# Altium schematic symbol library Regulator_Linear.SchLib: 1538 symbols (part 7 of 9)
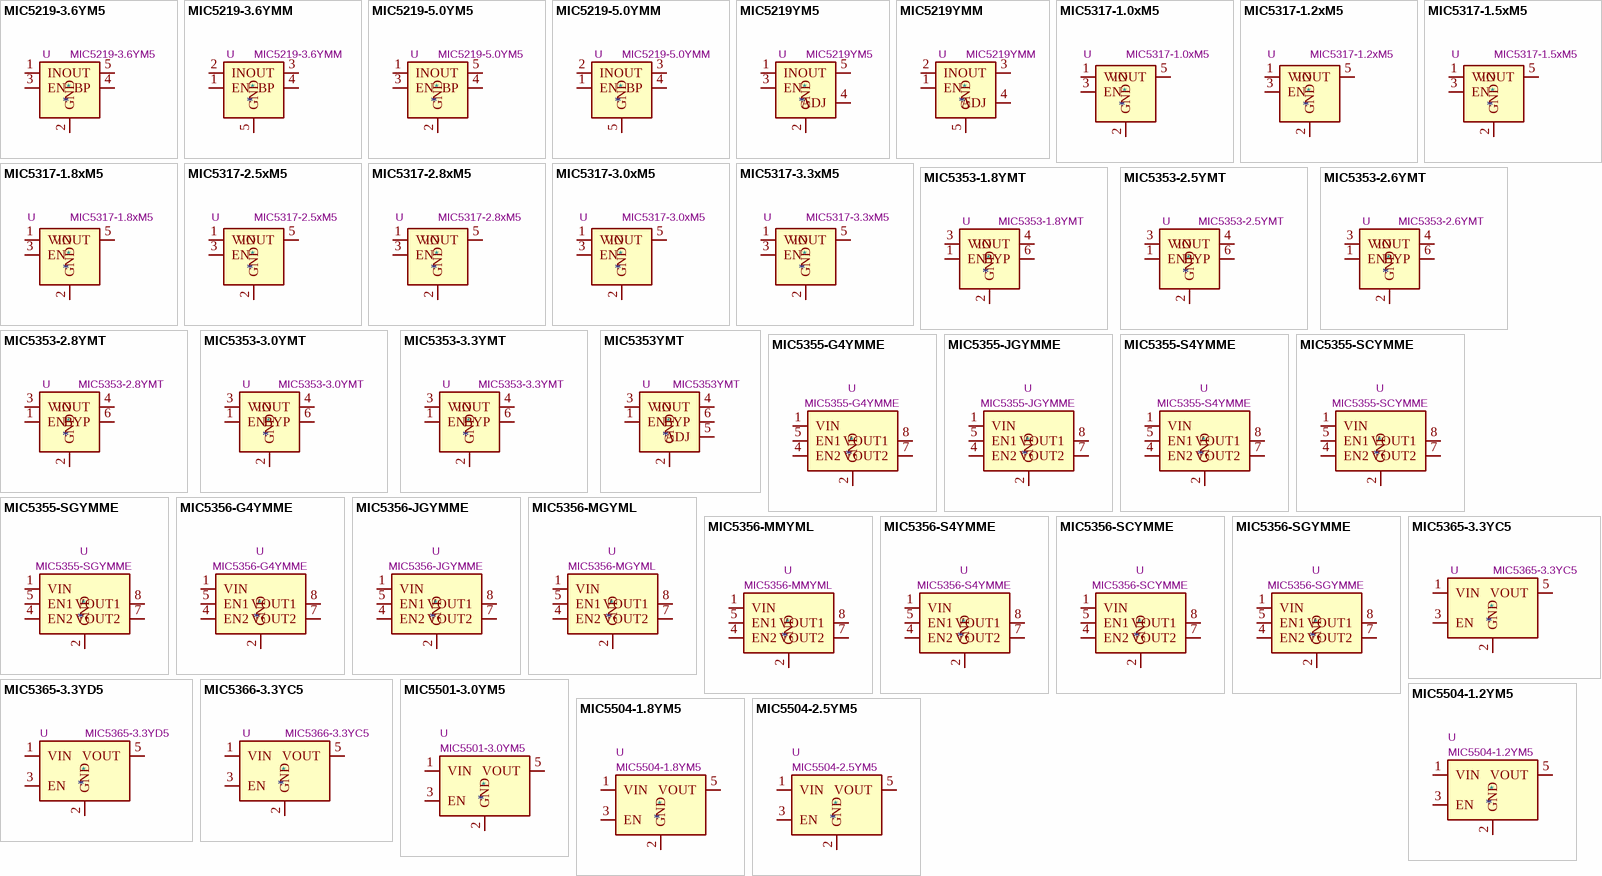
[diagram p44: symbols MIC5219-3.6YM5 to MIC5504-2.5YM5]

## MIC5366-3.3YC5
designator *  value MIC5366-3.3YC5  Reference: U
ki_keywords: Micrel LDO voltage regulator; ki_description: 150mA Low-dropout Voltage Regulator, Vout 3.3V, Output discharge circuit, Vin up to 5.5V, SC-70-5; ki_fp_filters: SOT*353*SC*70*; Footprint: Package_TO_SOT_SMD:SOT-353_SC-70-5; Datasheet: http://ww1.microchip.com/downloads/en/DeviceDoc/mic5365.pdf
pins: 1 VIN, 2 GND, 3 EN, 4 NC hidden, 5 VOUT

## MIC5501-3.0YM5
designator *  value MIC5501-3.0YM5  Reference: U
ki_keywords: Micrel LDO voltage regulator; ki_description: 300mA Low-dropout Voltage Regulator, Vout 3.0V, Vin up to 5.5V, SOT-23; ki_fp_filters: SOT?23?5*; Footprint: Package_TO_SOT_SMD:SOT-23-5; Datasheet: http://ww1.microchip.com/downloads/en/DeviceDoc/MIC550X.pdf
pins: 1 VIN, 2 GND, 3 EN, 4 NC hidden, 5 VOUT

## MIC5504-1.2YM5
designator *  value MIC5504-1.2YM5  Reference: U
ki_keywords: Micrel LDO voltage regulator; ki_description: 300mA Low-dropout Voltage Regulator, Vout 1.2V, Vin up to 5.5V, SOT-23; ki_fp_filters: SOT?23?5*; Footprint: Package_TO_SOT_SMD:SOT-23-5; Datasheet: http://ww1.microchip.com/downloads/en/DeviceDoc/MIC550X.pdf
pins: 1 VIN, 2 GND, 3 EN, 4 NC hidden, 5 VOUT

## MIC5504-1.8YM5
designator *  value MIC5504-1.8YM5  Reference: U
ki_keywords: Micrel LDO voltage regulator; ki_description: 300mA Low-dropout Voltage Regulator, Vout 1.8V, Vin up to 5.5V, SOT-23; ki_fp_filters: SOT?23?5*; Footprint: Package_TO_SOT_SMD:SOT-23-5; Datasheet: http://ww1.microchip.com/downloads/en/DeviceDoc/MIC550X.pdf
pins: 1 VIN, 2 GND, 3 EN, 4 NC hidden, 5 VOUT

## MIC5504-2.5YM5
designator *  value MIC5504-2.5YM5  Reference: U
ki_keywords: Micrel LDO voltage regulator; ki_description: 300mA Low-dropout Voltage Regulator, Vout 2.5V, Vin up to 5.5V, SOT-23; ki_fp_filters: SOT?23?5*; Footprint: Package_TO_SOT_SMD:SOT-23-5; Datasheet: http://ww1.microchip.com/downloads/en/DeviceDoc/MIC550X.pdf
pins: 1 VIN, 2 GND, 3 EN, 4 NC hidden, 5 VOUT

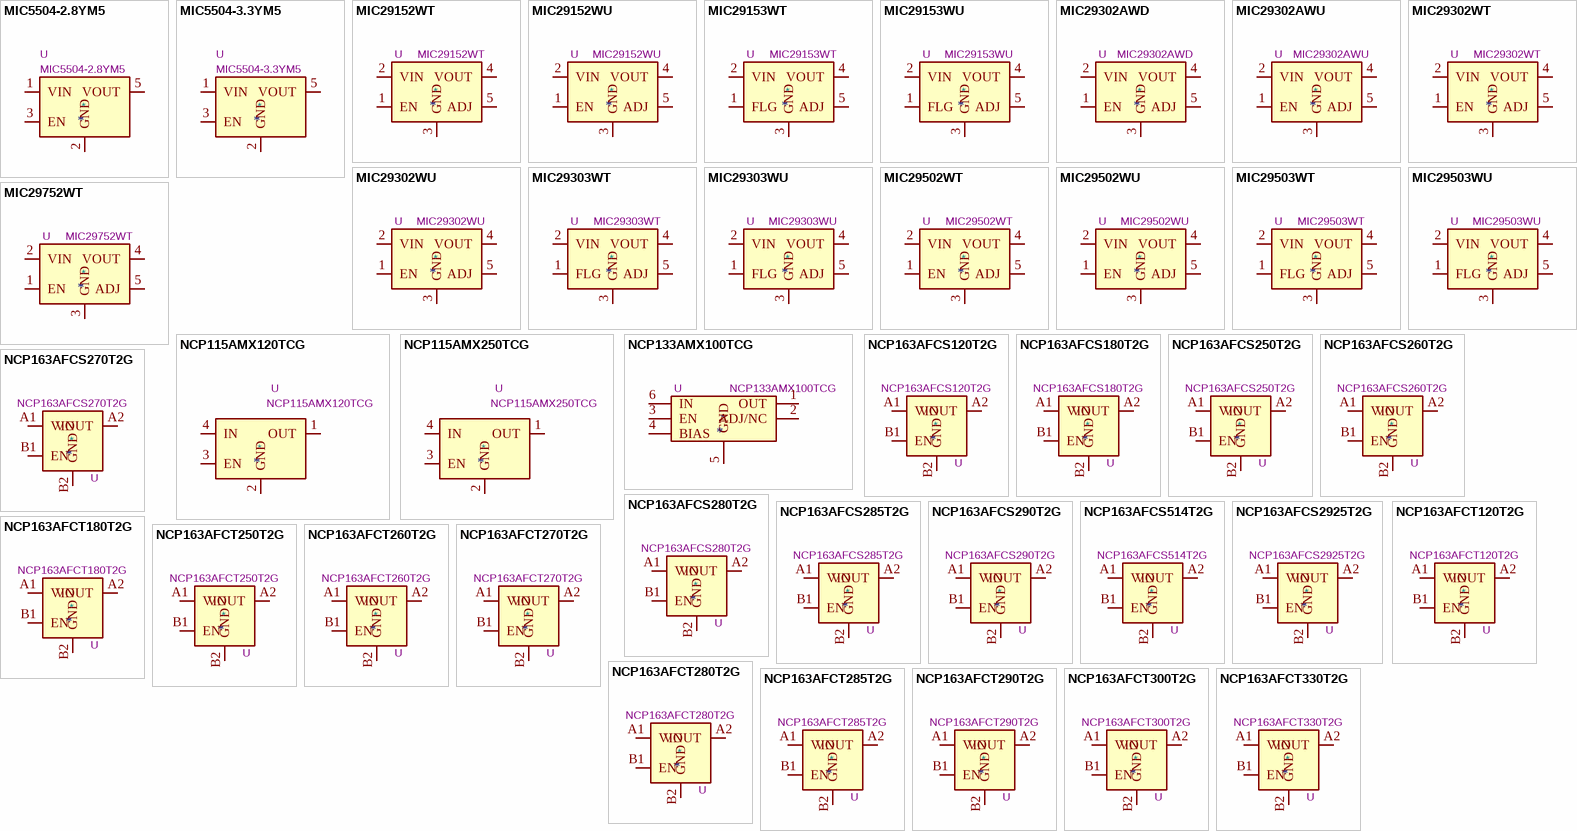
[diagram p27: symbols MIC5504-2.8YM5 to NCP163AFCT330T2G]

## MIC5504-2.8YM5
designator *  value MIC5504-2.8YM5  Reference: U
ki_keywords: Micrel LDO voltage regulator; ki_description: 300mA Low-dropout Voltage Regulator, Vout 2.8V, Vin up to 5.5V, SOT-23; ki_fp_filters: SOT?23?5*; Footprint: Package_TO_SOT_SMD:SOT-23-5; Datasheet: http://ww1.microchip.com/downloads/en/DeviceDoc/MIC550X.pdf
pins: 1 VIN, 2 GND, 3 EN, 4 NC hidden, 5 VOUT

## MIC5504-3.3YM5
designator *  value MIC5504-3.3YM5  Reference: U
ki_keywords: Micrel LDO voltage regulator; ki_description: 300mA Low-dropout Voltage Regulator, Vout 3.3V, Vin up to 5.5V, SOT-23; ki_fp_filters: SOT?23?5*; Footprint: Package_TO_SOT_SMD:SOT-23-5; Datasheet: http://ww1.microchip.com/downloads/en/DeviceDoc/MIC550X.pdf
pins: 1 VIN, 2 GND, 3 EN, 4 NC hidden, 5 VOUT

## MIC29152WT
designator *  value MIC29152WT  Reference: U
ki_keywords: 1.5A LDO linear voltage regulator adjustable positive; ki_description: 1.5A low dropout linear regulator, adjustable output, TO-220; ki_fp_filters: TO*220*; Footprint: Package_TO_SOT_THT:TO-220-5_P3.4x3.7mm_StaggerEven_Lead3.8mm_Vertical; Datasheet: http://ww1.microchip.com/downloads/en/devicedoc/20005685a.pdf
pins: 1 EN, 2 VIN, 3 GND, 4 VOUT, 5 ADJ

## MIC29152WU
designator *  value MIC29152WU  Reference: U
ki_keywords: 1.5A LDO linear voltage regulator adjustable positive; ki_description: 1.5A low dropout linear regulator, adjustable output, TO-252; ki_fp_filters: TO*252*; Footprint: Package_TO_SOT_SMD:TO-252-5_TabPin3; Datasheet: http://ww1.microchip.com/downloads/en/devicedoc/20005685a.pdf
pins: 1 EN, 2 VIN, 3 GND, 4 VOUT, 5 ADJ

## MIC29153WT
designator *  value MIC29153WT  Reference: U
ki_keywords: 1.5A LDO linear voltage regulator adjustable positive; ki_description: 1.5A low dropout linear regulator, adjustable output, TO-220; ki_fp_filters: TO*220*; Footprint: Package_TO_SOT_THT:TO-220-5_P3.4x3.7mm_StaggerEven_Lead3.8mm_Vertical; Datasheet: http://ww1.microchip.com/downloads/en/devicedoc/20005685a.pdf
pins: 1 FLG, 2 VIN, 3 GND, 4 VOUT, 5 ADJ

## MIC29153WU
designator *  value MIC29153WU  Reference: U
ki_keywords: 1.5A LDO linear voltage regulator adjustable positive; ki_description: 1.5A low dropout linear regulator, adjustable output, TO-263; ki_fp_filters: TO*263*; Footprint: Package_TO_SOT_SMD:TO-263-5_TabPin3; Datasheet: http://ww1.microchip.com/downloads/en/devicedoc/20005685a.pdf
pins: 1 FLG, 2 VIN, 3 GND, 4 VOUT, 5 ADJ

## MIC29302AWD
designator *  value MIC29302AWD  Reference: U
ki_keywords: 3A LDO linear voltage regulator adjustable positive; ki_description: 3A low dropout linear regulator, shutdown pin, 3V to 16V input voltage, 1.24V to 15V adjustable output, TO-252; ki_fp_filters: TO*252*; Footprint: Package_TO_SOT_SMD:TO-252-5_TabPin3; Datasheet: https://ww1.microchip.com/downloads/aemDocuments/documents/OTH/ProductDocuments/DataSheets/20005897B.pdf
pins: 1 EN, 2 VIN, 3 GND, 4 VOUT, 5 ADJ

## MIC29302AWU
designator *  value MIC29302AWU  Reference: U
ki_keywords: 3A LDO linear voltage regulator adjustable positive; ki_description: 3A low dropout linear regulator, shutdown pin, 3V to 16V input voltage, 1.24V to 15V adjustable output, TO-263; ki_fp_filters: TO*263*; Footprint: Package_TO_SOT_SMD:TO-263-5_TabPin3; Datasheet: https://ww1.microchip.com/downloads/aemDocuments/documents/OTH/ProductDocuments/DataSheets/20005897B.pdf
pins: 1 EN, 2 VIN, 3 GND, 4 VOUT, 5 ADJ

## MIC29302WT
designator *  value MIC29302WT  Reference: U
ki_keywords: 3A LDO linear voltage regulator adjustable positive; ki_description: 3A low dropout linear regulator, adjustable output, TO-220; ki_fp_filters: TO*220*; Footprint: Package_TO_SOT_THT:TO-220-5_P3.4x3.7mm_StaggerEven_Lead3.8mm_Vertical; Datasheet: http://ww1.microchip.com/downloads/en/devicedoc/20005685a.pdf
pins: 1 EN, 2 VIN, 3 GND, 4 VOUT, 5 ADJ

## MIC29302WU
designator *  value MIC29302WU  Reference: U
ki_keywords: 3A LDO linear voltage regulator adjustable positive; ki_description: 3A low dropout linear regulator, adjustable output, TO-263; ki_fp_filters: TO*263*; Footprint: Package_TO_SOT_SMD:TO-263-5_TabPin3; Datasheet: http://ww1.microchip.com/downloads/en/devicedoc/20005685a.pdf
pins: 1 EN, 2 VIN, 3 GND, 4 VOUT, 5 ADJ

## MIC29303WT
designator *  value MIC29303WT  Reference: U
ki_keywords: 3A LDO linear voltage regulator adjustable positive; ki_description: 3A low dropout linear regulator, adjustable output, TO-220; ki_fp_filters: TO*220*; Footprint: Package_TO_SOT_THT:TO-220-5_P3.4x3.7mm_StaggerEven_Lead3.8mm_Vertical; Datasheet: http://ww1.microchip.com/downloads/en/devicedoc/20005685a.pdf
pins: 1 FLG, 2 VIN, 3 GND, 4 VOUT, 5 ADJ

## MIC29303WU
designator *  value MIC29303WU  Reference: U
ki_keywords: 3A LDO linear voltage regulator adjustable positive; ki_description: 3A low dropout linear regulator, adjustable output, TO-263; ki_fp_filters: TO*263*; Footprint: Package_TO_SOT_SMD:TO-263-5_TabPin3; Datasheet: http://ww1.microchip.com/downloads/en/devicedoc/20005685a.pdf
pins: 1 FLG, 2 VIN, 3 GND, 4 VOUT, 5 ADJ

## MIC29502WT
designator *  value MIC29502WT  Reference: U
ki_keywords: 5A LDO linear voltage regulator adjustable positive; ki_description: 5A low dropout linear regulator, adjustable output, TO-220; ki_fp_filters: TO*220*; Footprint: Package_TO_SOT_THT:TO-220-5_P3.4x3.7mm_StaggerEven_Lead3.8mm_Vertical; Datasheet: http://ww1.microchip.com/downloads/en/devicedoc/20005685a.pdf
pins: 1 EN, 2 VIN, 3 GND, 4 VOUT, 5 ADJ

## MIC29502WU
designator *  value MIC29502WU  Reference: U
ki_keywords: 5A LDO linear voltage regulator adjustable positive; ki_description: 5A low dropout linear regulator, adjustable output, TO-263; ki_fp_filters: TO*263*; Footprint: Package_TO_SOT_SMD:TO-263-5_TabPin3; Datasheet: http://ww1.microchip.com/downloads/en/devicedoc/20005685a.pdf
pins: 1 EN, 2 VIN, 3 GND, 4 VOUT, 5 ADJ

## MIC29503WT
designator *  value MIC29503WT  Reference: U
ki_keywords: 5A LDO linear voltage regulator adjustable positive; ki_description: 5A low dropout linear regulator, adjustable output, TO-220; ki_fp_filters: TO*220*; Footprint: Package_TO_SOT_THT:TO-220-5_P3.4x3.7mm_StaggerEven_Lead3.8mm_Vertical; Datasheet: http://ww1.microchip.com/downloads/en/devicedoc/20005685a.pdf
pins: 1 FLG, 2 VIN, 3 GND, 4 VOUT, 5 ADJ

## MIC29503WU
designator *  value MIC29503WU  Reference: U
ki_keywords: 5A LDO linear voltage regulator adjustable positive; ki_description: 5A low dropout linear regulator, adjustable output, TO-263; ki_fp_filters: TO*263*; Footprint: Package_TO_SOT_SMD:TO-263-5_TabPin3; Datasheet: http://ww1.microchip.com/downloads/en/devicedoc/20005685a.pdf
pins: 1 FLG, 2 VIN, 3 GND, 4 VOUT, 5 ADJ

## MIC29752WT
designator *  value MIC29752WT  Reference: U
ki_keywords: 7.5A LDO linear voltage regulator adjustable positive; ki_description: 7.5A low dropout linear regulator, adjustable output, TO-247; ki_fp_filters: TO*247*; Footprint: Package_TO_SOT_THT:TO-247-5_Vertical; Datasheet: http://ww1.microchip.com/downloads/en/devicedoc/20005685a.pdf
pins: 1 EN, 2 VIN, 3 GND, 4 VOUT, 5 ADJ

## NCP115AMX120TCG
designator *  value NCP115AMX120TCG  Reference: U
ki_keywords: Single Output LDO; ki_description: 300mA Low-Dropout Linear Regulators, 1.2V output voltage, LDO with low noise and enable pin, XDFN-4; ki_fp_filters: OnSemi*XDFN4*1EP*1.0x1.0mm*; Footprint: Package_DFN_QFN:OnSemi_XDFN4-1EP_1.0x1.0mm_EP0.52x0.52mm; Datasheet: https://www.onsemi.com/pub/Collateral/NCP115-D.PDF
pins: 1 OUT, 2 GND, 3 EN, 4 IN, 5 GND hidden

## NCP115AMX250TCG
designator *  value NCP115AMX250TCG  Reference: U
ki_keywords: Single Output LDO; ki_description: 300mA Low-Dropout Linear Regulators, 2.5V output voltage, LDO with low noise and enable pin, XDFN-4; ki_fp_filters: OnSemi*XDFN4*1EP*1.0x1.0mm*; Footprint: Package_DFN_QFN:OnSemi_XDFN4-1EP_1.0x1.0mm_EP0.52x0.52mm; Datasheet: https://www.onsemi.com/pub/Collateral/NCP115-D.PDF
pins: 1 OUT, 2 GND, 3 EN, 4 IN, 5 GND hidden

## NCP133AMX100TCG
designator *  value NCP133AMX100TCG  Reference: U
ki_keywords: Single Output LDO; ki_description: 500  mA  VLDO  equipped  with  NMOS  pass transistor  and  a  separate  bias  supply  voltage; ki_fp_filters: DFN?6?1EP*1.2x1.2mm*P0.4mm*; Datasheet: http://www.onsemi.com/pub/Collateral/NCP133-D.PDF
pins: 1 OUT, 2 ADJ/NC, 3 EN, 4 BIAS, 5 GND, 6 IN, 7 GND hidden

## NCP163AFCS120T2G
designator *  value NCP163AFCS120T2G  Reference: U
ki_keywords: LDO regulator voltage; ki_description: 250mA low-noise LDO, 2.2V-5.5V input, 1.2V output, WLCSP-4; ki_fp_filters: WLCSP*; Footprint: Package_CSP:WLCSP-4_0.64x0.64mm_P0.35mm; Datasheet: https://www.onsemi.com/pdf/datasheet/ncp163-d.pdf
pins: A1 VIN, A2 VOUT, B1 EN, B2 GND

## NCP163AFCS180T2G
designator *  value NCP163AFCS180T2G  Reference: U
ki_keywords: LDO regulator voltage; ki_description: 250mA low-noise LDO, 2.2V-5.5V input, 1.8V output, WLCSP-4; ki_fp_filters: WLCSP*; Footprint: Package_CSP:WLCSP-4_0.64x0.64mm_P0.35mm; Datasheet: https://www.onsemi.com/pdf/datasheet/ncp163-d.pdf
pins: A1 VIN, A2 VOUT, B1 EN, B2 GND

## NCP163AFCS250T2G
designator *  value NCP163AFCS250T2G  Reference: U
ki_keywords: LDO regulator voltage; ki_description: 250mA low-noise LDO, 2.2V-5.5V input, 2.5V output, WLCSP-4; ki_fp_filters: WLCSP*; Footprint: Package_CSP:WLCSP-4_0.64x0.64mm_P0.35mm; Datasheet: https://www.onsemi.com/pdf/datasheet/ncp163-d.pdf
pins: A1 VIN, A2 VOUT, B1 EN, B2 GND

## NCP163AFCS260T2G
designator *  value NCP163AFCS260T2G  Reference: U
ki_keywords: LDO regulator voltage; ki_description: 250mA low-noise LDO, 2.2V-5.5V input, 2.6V output, WLCSP-4; ki_fp_filters: WLCSP*; Footprint: Package_CSP:WLCSP-4_0.64x0.64mm_P0.35mm; Datasheet: https://www.onsemi.com/pdf/datasheet/ncp163-d.pdf
pins: A1 VIN, A2 VOUT, B1 EN, B2 GND

## NCP163AFCS270T2G
designator *  value NCP163AFCS270T2G  Reference: U
ki_keywords: LDO regulator voltage; ki_description: 250mA low-noise LDO, 2.2V-5.5V input, 2.7V output, WLCSP-4; ki_fp_filters: WLCSP*; Footprint: Package_CSP:WLCSP-4_0.64x0.64mm_P0.35mm; Datasheet: https://www.onsemi.com/pdf/datasheet/ncp163-d.pdf
pins: A1 VIN, A2 VOUT, B1 EN, B2 GND

## NCP163AFCS280T2G
designator *  value NCP163AFCS280T2G  Reference: U
ki_keywords: LDO regulator voltage; ki_description: 250mA low-noise LDO, 2.2V-5.5V input, 2.8V output, WLCSP-4; ki_fp_filters: WLCSP*; Footprint: Package_CSP:WLCSP-4_0.64x0.64mm_P0.35mm; Datasheet: https://www.onsemi.com/pdf/datasheet/ncp163-d.pdf
pins: A1 VIN, A2 VOUT, B1 EN, B2 GND

## NCP163AFCS285T2G
designator *  value NCP163AFCS285T2G  Reference: U
ki_keywords: LDO regulator voltage; ki_description: 250mA low-noise LDO, 2.2V-5.5V input, 2.85V output, WLCSP-4; ki_fp_filters: WLCSP*; Footprint: Package_CSP:WLCSP-4_0.64x0.64mm_P0.35mm; Datasheet: https://www.onsemi.com/pdf/datasheet/ncp163-d.pdf
pins: A1 VIN, A2 VOUT, B1 EN, B2 GND

## NCP163AFCS290T2G
designator *  value NCP163AFCS290T2G  Reference: U
ki_keywords: LDO regulator voltage; ki_description: 250mA low-noise LDO, 2.2V-5.5V input, 2.9V output, WLCSP-4; ki_fp_filters: WLCSP*; Footprint: Package_CSP:WLCSP-4_0.64x0.64mm_P0.35mm; Datasheet: https://www.onsemi.com/pdf/datasheet/ncp163-d.pdf
pins: A1 VIN, A2 VOUT, B1 EN, B2 GND

## NCP163AFCS514T2G
designator *  value NCP163AFCS514T2G  Reference: U
ki_keywords: LDO regulator voltage; ki_description: 250mA low-noise LDO, 2.2V-5.5V input, 5.14V output, WLCSP-4; ki_fp_filters: WLCSP*; Footprint: Package_CSP:WLCSP-4_0.64x0.64mm_P0.35mm; Datasheet: https://www.onsemi.com/pdf/datasheet/ncp163-d.pdf
pins: A1 VIN, A2 VOUT, B1 EN, B2 GND

## NCP163AFCS2925T2G
designator *  value NCP163AFCS2925T2G  Reference: U
ki_keywords: LDO regulator voltage; ki_description: 250mA low-noise LDO, 2.2V-5.5V input, 2.925V output, WLCSP-4; ki_fp_filters: WLCSP*; Footprint: Package_CSP:WLCSP-4_0.64x0.64mm_P0.35mm; Datasheet: https://www.onsemi.com/pdf/datasheet/ncp163-d.pdf
pins: A1 VIN, A2 VOUT, B1 EN, B2 GND

## NCP163AFCT120T2G
designator *  value NCP163AFCT120T2G  Reference: U
ki_keywords: LDO regulator voltage; ki_description: 250mA low-noise LDO, 2.2V-5.5V input, 1.2V output, WLCSP-4; ki_fp_filters: WLCSP*; Footprint: Package_CSP:WLCSP-4_0.64x0.64mm_P0.35mm; Datasheet: https://www.onsemi.com/pdf/datasheet/ncp163-d.pdf
pins: A1 VIN, A2 VOUT, B1 EN, B2 GND

## NCP163AFCT180T2G
designator *  value NCP163AFCT180T2G  Reference: U
ki_keywords: LDO regulator voltage; ki_description: 250mA low-noise LDO, 2.2V-5.5V input, 1.8V output, WLCSP-4; ki_fp_filters: WLCSP*; Footprint: Package_CSP:WLCSP-4_0.64x0.64mm_P0.35mm; Datasheet: https://www.onsemi.com/pdf/datasheet/ncp163-d.pdf
pins: A1 VIN, A2 VOUT, B1 EN, B2 GND

## NCP163AFCT250T2G
designator *  value NCP163AFCT250T2G  Reference: U
ki_keywords: LDO regulator voltage; ki_description: 250mA low-noise LDO, 2.2V-5.5V input, 2.5V output, WLCSP-4; ki_fp_filters: WLCSP*; Footprint: Package_CSP:WLCSP-4_0.64x0.64mm_P0.35mm; Datasheet: https://www.onsemi.com/pdf/datasheet/ncp163-d.pdf
pins: A1 VIN, A2 VOUT, B1 EN, B2 GND

## NCP163AFCT260T2G
designator *  value NCP163AFCT260T2G  Reference: U
ki_keywords: LDO regulator voltage; ki_description: 250mA low-noise LDO, 2.2V-5.5V input, 2.6V output, WLCSP-4; ki_fp_filters: WLCSP*; Footprint: Package_CSP:WLCSP-4_0.64x0.64mm_P0.35mm; Datasheet: https://www.onsemi.com/pdf/datasheet/ncp163-d.pdf
pins: A1 VIN, A2 VOUT, B1 EN, B2 GND

## NCP163AFCT270T2G
designator *  value NCP163AFCT270T2G  Reference: U
ki_keywords: LDO regulator voltage; ki_description: 250mA low-noise LDO, 2.2V-5.5V input, 2.7V output, WLCSP-4; ki_fp_filters: WLCSP*; Footprint: Package_CSP:WLCSP-4_0.64x0.64mm_P0.35mm; Datasheet: https://www.onsemi.com/pdf/datasheet/ncp163-d.pdf
pins: A1 VIN, A2 VOUT, B1 EN, B2 GND

## NCP163AFCT280T2G
designator *  value NCP163AFCT280T2G  Reference: U
ki_keywords: LDO regulator voltage; ki_description: 250mA low-noise LDO, 2.2V-5.5V input, 2.8V output, WLCSP-4; ki_fp_filters: WLCSP*; Footprint: Package_CSP:WLCSP-4_0.64x0.64mm_P0.35mm; Datasheet: https://www.onsemi.com/pdf/datasheet/ncp163-d.pdf
pins: A1 VIN, A2 VOUT, B1 EN, B2 GND

## NCP163AFCT285T2G
designator *  value NCP163AFCT285T2G  Reference: U
ki_keywords: LDO regulator voltage; ki_description: 250mA low-noise LDO, 2.2V-5.5V input, 2.85V output, WLCSP-4; ki_fp_filters: WLCSP*; Footprint: Package_CSP:WLCSP-4_0.64x0.64mm_P0.35mm; Datasheet: https://www.onsemi.com/pdf/datasheet/ncp163-d.pdf
pins: A1 VIN, A2 VOUT, B1 EN, B2 GND

## NCP163AFCT290T2G
designator *  value NCP163AFCT290T2G  Reference: U
ki_keywords: LDO regulator voltage; ki_description: 250mA low-noise LDO, 2.2V-5.5V input, 2.9V output, WLCSP-4; ki_fp_filters: WLCSP*; Footprint: Package_CSP:WLCSP-4_0.64x0.64mm_P0.35mm; Datasheet: https://www.onsemi.com/pdf/datasheet/ncp163-d.pdf
pins: A1 VIN, A2 VOUT, B1 EN, B2 GND

## NCP163AFCT300T2G
designator *  value NCP163AFCT300T2G  Reference: U
ki_keywords: LDO regulator voltage; ki_description: 250mA low-noise LDO, 2.2V-5.5V input, 3.0V output, WLCSP-4; ki_fp_filters: WLCSP*; Footprint: Package_CSP:WLCSP-4_0.64x0.64mm_P0.35mm; Datasheet: https://www.onsemi.com/pdf/datasheet/ncp163-d.pdf
pins: A1 VIN, A2 VOUT, B1 EN, B2 GND

## NCP163AFCT330T2G
designator *  value NCP163AFCT330T2G  Reference: U
ki_keywords: LDO regulator voltage; ki_description: 250mA low-noise LDO, 2.2V-5.5V input, 3.3V output, WLCSP-4; ki_fp_filters: WLCSP*; Footprint: Package_CSP:WLCSP-4_0.64x0.64mm_P0.35mm; Datasheet: https://www.onsemi.com/pdf/datasheet/ncp163-d.pdf
pins: A1 VIN, A2 VOUT, B1 EN, B2 GND

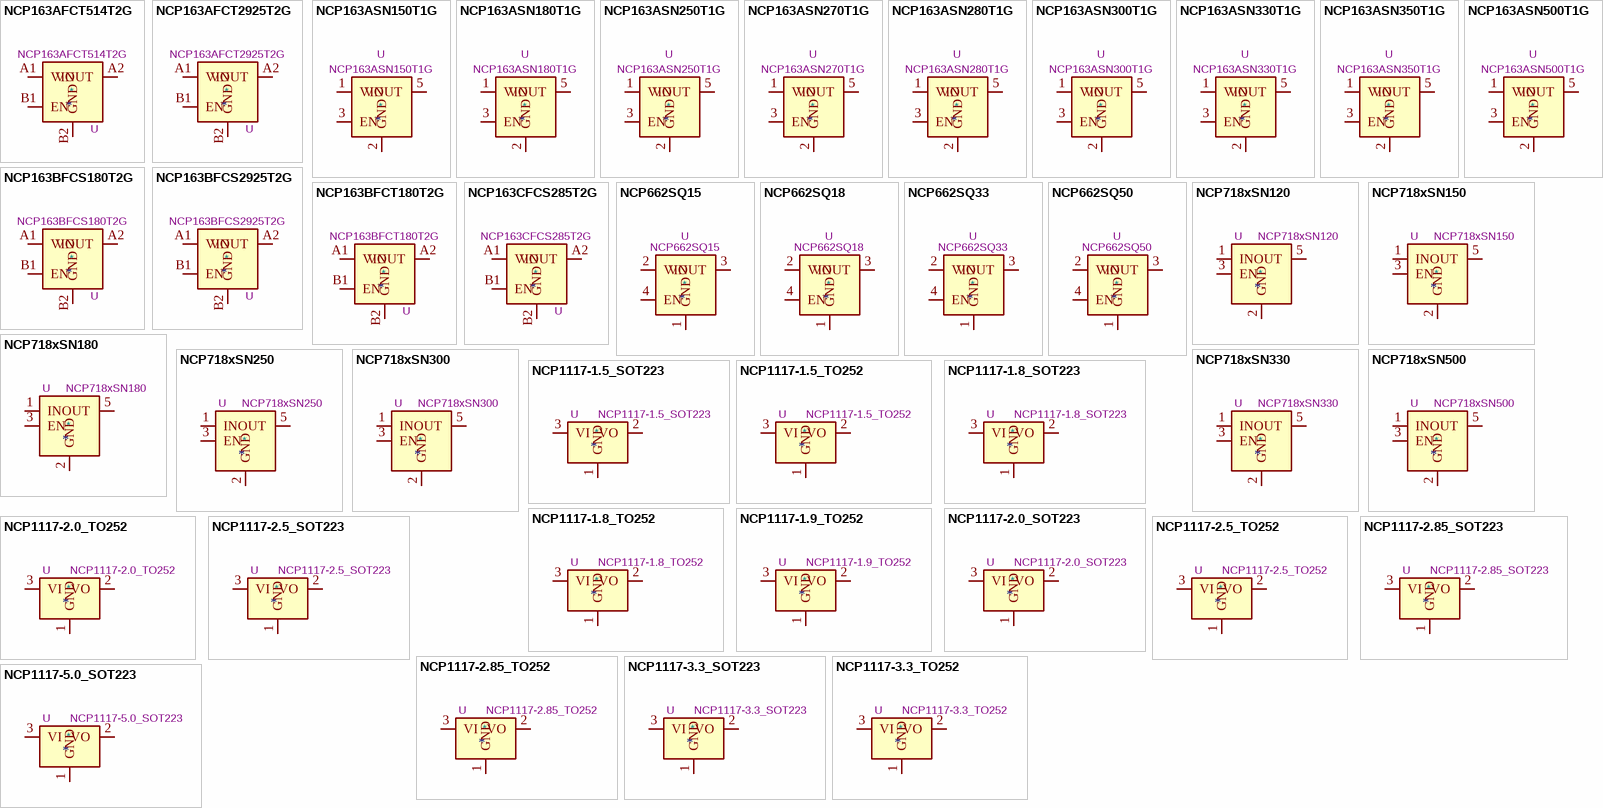
[diagram p28: symbols NCP163AFCT514T2G to NCP1117-5.0_SOT223]

## NCP163AFCT514T2G
designator *  value NCP163AFCT514T2G  Reference: U
ki_keywords: LDO regulator voltage; ki_description: 250mA low-noise LDO, 2.2V-5.5V input, 5.14V output, WLCSP-4; ki_fp_filters: WLCSP*; Footprint: Package_CSP:WLCSP-4_0.64x0.64mm_P0.35mm; Datasheet: https://www.onsemi.com/pdf/datasheet/ncp163-d.pdf
pins: A1 VIN, A2 VOUT, B1 EN, B2 GND

## NCP163AFCT2925T2G
designator *  value NCP163AFCT2925T2G  Reference: U
ki_keywords: LDO regulator voltage; ki_description: 250mA low-noise LDO, 2.2V-5.5V input, 2.925V output, WLCSP-4; ki_fp_filters: WLCSP*; Footprint: Package_CSP:WLCSP-4_0.64x0.64mm_P0.35mm; Datasheet: https://www.onsemi.com/pdf/datasheet/ncp163-d.pdf
pins: A1 VIN, A2 VOUT, B1 EN, B2 GND

## NCP163ASN150T1G
designator *  value NCP163ASN150T1G  Reference: U
ki_keywords: LDO regulator voltage; ki_description: 250mA low-noise LDO, 2.2V-5.5V input, 1.5V output, SOT-23-5; ki_fp_filters: SOT?23*; Footprint: Package_TO_SOT_SMD:SOT-23-5; Datasheet: https://www.onsemi.com/pdf/datasheet/ncp163-d.pdf
pins: 1 VIN, 2 GND, 3 EN, 4 NC hidden, 5 VOUT

## NCP163ASN180T1G
designator *  value NCP163ASN180T1G  Reference: U
ki_keywords: LDO regulator voltage; ki_description: 250mA low-noise LDO, 2.2V-5.5V input, 1.8V output, SOT-23-5; ki_fp_filters: SOT?23*; Footprint: Package_TO_SOT_SMD:SOT-23-5; Datasheet: https://www.onsemi.com/pdf/datasheet/ncp163-d.pdf
pins: 1 VIN, 2 GND, 3 EN, 4 NC hidden, 5 VOUT

## NCP163ASN250T1G
designator *  value NCP163ASN250T1G  Reference: U
ki_keywords: LDO regulator voltage; ki_description: 250mA low-noise LDO, 2.2V-5.5V input, 2.5V output, SOT-23-5; ki_fp_filters: SOT?23*; Footprint: Package_TO_SOT_SMD:SOT-23-5; Datasheet: https://www.onsemi.com/pdf/datasheet/ncp163-d.pdf
pins: 1 VIN, 2 GND, 3 EN, 4 NC hidden, 5 VOUT

## NCP163ASN270T1G
designator *  value NCP163ASN270T1G  Reference: U
ki_keywords: LDO regulator voltage; ki_description: 250mA low-noise LDO, 2.2V-5.5V input, 2.7V output, SOT-23-5; ki_fp_filters: SOT?23*; Footprint: Package_TO_SOT_SMD:SOT-23-5; Datasheet: https://www.onsemi.com/pdf/datasheet/ncp163-d.pdf
pins: 1 VIN, 2 GND, 3 EN, 4 NC hidden, 5 VOUT

## NCP163ASN280T1G
designator *  value NCP163ASN280T1G  Reference: U
ki_keywords: LDO regulator voltage; ki_description: 250mA low-noise LDO, 2.2V-5.5V input, 2.8V output, SOT-23-5; ki_fp_filters: SOT?23*; Footprint: Package_TO_SOT_SMD:SOT-23-5; Datasheet: https://www.onsemi.com/pdf/datasheet/ncp163-d.pdf
pins: 1 VIN, 2 GND, 3 EN, 4 NC hidden, 5 VOUT

## NCP163ASN300T1G
designator *  value NCP163ASN300T1G  Reference: U
ki_keywords: LDO regulator voltage; ki_description: 250mA low-noise LDO, 2.2V-5.5V input, 3.0V output, SOT-23-5; ki_fp_filters: SOT?23*; Footprint: Package_TO_SOT_SMD:SOT-23-5; Datasheet: https://www.onsemi.com/pdf/datasheet/ncp163-d.pdf
pins: 1 VIN, 2 GND, 3 EN, 4 NC hidden, 5 VOUT

## NCP163ASN330T1G
designator *  value NCP163ASN330T1G  Reference: U
ki_keywords: LDO regulator voltage; ki_description: 250mA low-noise LDO, 2.2V-5.5V input, 3.3V output, SOT-23-5; ki_fp_filters: SOT?23*; Footprint: Package_TO_SOT_SMD:SOT-23-5; Datasheet: https://www.onsemi.com/pdf/datasheet/ncp163-d.pdf
pins: 1 VIN, 2 GND, 3 EN, 4 NC hidden, 5 VOUT

## NCP163ASN350T1G
designator *  value NCP163ASN350T1G  Reference: U
ki_keywords: LDO regulator voltage; ki_description: 250mA low-noise LDO, 2.2V-5.5V input, 3.5V output, SOT-23-5; ki_fp_filters: SOT?23*; Footprint: Package_TO_SOT_SMD:SOT-23-5; Datasheet: https://www.onsemi.com/pdf/datasheet/ncp163-d.pdf
pins: 1 VIN, 2 GND, 3 EN, 4 NC hidden, 5 VOUT

## NCP163ASN500T1G
designator *  value NCP163ASN500T1G  Reference: U
ki_keywords: LDO regulator voltage; ki_description: 250mA low-noise LDO, 2.2V-5.5V input, 5.0V output, SOT-23-5; ki_fp_filters: SOT?23*; Footprint: Package_TO_SOT_SMD:SOT-23-5; Datasheet: https://www.onsemi.com/pdf/datasheet/ncp163-d.pdf
pins: 1 VIN, 2 GND, 3 EN, 4 NC hidden, 5 VOUT

## NCP163BFCS180T2G
designator *  value NCP163BFCS180T2G  Reference: U
ki_keywords: LDO regulator voltage; ki_description: 250mA low-noise LDO, 2.2V-5.5V input, 1.8V output, WLCSP-4; ki_fp_filters: WLCSP*; Footprint: Package_CSP:WLCSP-4_0.64x0.64mm_P0.35mm; Datasheet: https://www.onsemi.com/pdf/datasheet/ncp163-d.pdf
pins: A1 VIN, A2 VOUT, B1 EN, B2 GND

## NCP163BFCS2925T2G
designator *  value NCP163BFCS2925T2G  Reference: U
ki_keywords: LDO regulator voltage; ki_description: 250mA low-noise LDO, 2.2V-5.5V input, 2.925V output, WLCSP-4; ki_fp_filters: WLCSP*; Footprint: Package_CSP:WLCSP-4_0.64x0.64mm_P0.35mm; Datasheet: https://www.onsemi.com/pdf/datasheet/ncp163-d.pdf
pins: A1 VIN, A2 VOUT, B1 EN, B2 GND

## NCP163BFCT180T2G
designator *  value NCP163BFCT180T2G  Reference: U
ki_keywords: LDO regulator voltage; ki_description: 250mA low-noise LDO, 2.2V-5.5V input, 2.925V output, WLCSP-4; ki_fp_filters: WLCSP*; Footprint: Package_CSP:WLCSP-4_0.64x0.64mm_P0.35mm; Datasheet: https://www.onsemi.com/pdf/datasheet/ncp163-d.pdf
pins: A1 VIN, A2 VOUT, B1 EN, B2 GND

## NCP163CFCS285T2G
designator *  value NCP163CFCS285T2G  Reference: U
ki_keywords: LDO regulator voltage; ki_description: 250mA low-noise LDO, 2.2V-5.5V input, 2.85V output, WLCSP-4; ki_fp_filters: WLCSP*; Footprint: Package_CSP:WLCSP-4_0.64x0.64mm_P0.35mm; Datasheet: https://www.onsemi.com/pdf/datasheet/ncp163-d.pdf
pins: A1 VIN, A2 VOUT, B1 EN, B2 GND

## NCP662SQ15
designator *  value NCP662SQ15  Reference: U
ki_keywords: LDO regulator voltage; ki_description: 100-mA, 12V Max. Input, Ultralow-IQ LDO, 1.5V, SC-82AB; ki_fp_filters: SC?82AB*; Footprint: Package_TO_SOT_SMD:SC-82AB; Datasheet: https://www.onsemi.com/pub/Collateral/NCP662-D.PDF
pins: 1 GND, 2 VIN, 3 VOUT, 4 EN

## NCP662SQ18
designator *  value NCP662SQ18  Reference: U
ki_keywords: LDO regulator voltage; ki_description: 100-mA, 12V Max. Input, Ultralow-IQ LDO, 1.8V, SC-82AB; ki_fp_filters: SC?82AB*; Footprint: Package_TO_SOT_SMD:SC-82AB; Datasheet: https://www.onsemi.com/pub/Collateral/NCP662-D.PDF
pins: 1 GND, 2 VIN, 3 VOUT, 4 EN

## NCP662SQ33
designator *  value NCP662SQ33  Reference: U
ki_keywords: LDO regulator voltage; ki_description: 100-mA, 12V Max. Input, Ultralow-IQ LDO, 3.3V, SC-82AB; ki_fp_filters: SC?82AB*; Footprint: Package_TO_SOT_SMD:SC-82AB; Datasheet: https://www.onsemi.com/pub/Collateral/NCP662-D.PDF
pins: 1 GND, 2 VIN, 3 VOUT, 4 EN

## NCP662SQ50
designator *  value NCP662SQ50  Reference: U
ki_keywords: LDO regulator voltage; ki_description: 100-mA, 12V Max. Input, Ultralow-IQ LDO, 5.0V, SC-82AB; ki_fp_filters: SC?82AB*; Footprint: Package_TO_SOT_SMD:SC-82AB; Datasheet: https://www.onsemi.com/pub/Collateral/NCP662-D.PDF
pins: 1 GND, 2 VIN, 3 VOUT, 4 EN

## NCP718xSN120
designator *  value NCP718xSN120  Reference: U
ki_keywords: Single Output LDO Wide Input; ki_description: 300-mA, Wide Input Voltage, Low-IQ LDO, 1.2V, SOT-23; ki_fp_filters: SOT?23*; Footprint: Package_TO_SOT_SMD:SOT-23-5; Datasheet: https://www.onsemi.com/pub/Collateral/NCP718-D.PDF
pins: 1 IN, 2 GND, 3 EN, 4 NC hidden, 5 OUT

## NCP718xSN150
designator *  value NCP718xSN150  Reference: U
ki_keywords: Single Output LDO Wide Input; ki_description: 300-mA, Wide Input Voltage, Low-IQ LDO, 1.5V, SOT-23; ki_fp_filters: SOT?23*; Footprint: Package_TO_SOT_SMD:SOT-23-5; Datasheet: https://www.onsemi.com/pub/Collateral/NCP718-D.PDF
pins: 1 IN, 2 GND, 3 EN, 4 NC hidden, 5 OUT

## NCP718xSN180
designator *  value NCP718xSN180  Reference: U
ki_keywords: Single Output LDO Wide Input; ki_description: 300-mA, Wide Input Voltage, Low-IQ LDO, 1.8V, SOT-23; ki_fp_filters: SOT?23*; Footprint: Package_TO_SOT_SMD:SOT-23-5; Datasheet: https://www.onsemi.com/pub/Collateral/NCP718-D.PDF
pins: 1 IN, 2 GND, 3 EN, 4 NC hidden, 5 OUT

## NCP718xSN250
designator *  value NCP718xSN250  Reference: U
ki_keywords: Single Output LDO Wide Input; ki_description: 300-mA, Wide Input Voltage, Low-IQ LDO, 2.5V, SOT-23; ki_fp_filters: SOT?23*; Footprint: Package_TO_SOT_SMD:SOT-23-5; Datasheet: https://www.onsemi.com/pub/Collateral/NCP718-D.PDF
pins: 1 IN, 2 GND, 3 EN, 4 NC hidden, 5 OUT

## NCP718xSN300
designator *  value NCP718xSN300  Reference: U
ki_keywords: Single Output LDO Wide Input; ki_description: 300-mA, Wide Input Voltage, Low-IQ LDO, 3.0V, SOT-23; ki_fp_filters: SOT?23*; Footprint: Package_TO_SOT_SMD:SOT-23-5; Datasheet: https://www.onsemi.com/pub/Collateral/NCP718-D.PDF
pins: 1 IN, 2 GND, 3 EN, 4 NC hidden, 5 OUT

## NCP718xSN330
designator *  value NCP718xSN330  Reference: U
ki_keywords: Single Output LDO Wide Input; ki_description: 300-mA, Wide Input Voltage, Low-IQ LDO, 3.3V, SOT-23; ki_fp_filters: SOT?23*; Footprint: Package_TO_SOT_SMD:SOT-23-5; Datasheet: https://www.onsemi.com/pub/Collateral/NCP718-D.PDF
pins: 1 IN, 2 GND, 3 EN, 4 NC hidden, 5 OUT

## NCP718xSN500
designator *  value NCP718xSN500  Reference: U
ki_keywords: Single Output LDO Wide Input; ki_description: 300-mA, Wide Input Voltage, Low-IQ LDO, 5.0V, SOT-23; ki_fp_filters: SOT?23*; Footprint: Package_TO_SOT_SMD:SOT-23-5; Datasheet: https://www.onsemi.com/pub/Collateral/NCP718-D.PDF
pins: 1 IN, 2 GND, 3 EN, 4 NC hidden, 5 OUT

## NCP1117-1.5_SOT223
designator *  value NCP1117-1.5_SOT223  Reference: U
ki_keywords: REGULATOR LDO 1.5V; ki_description: 1A Low drop-out regulator, Fixed Output 1.5V, SOT-223; ki_fp_filters: SOT?223*TabPin2*; Footprint: Package_TO_SOT_SMD:SOT-223-3_TabPin2; Datasheet: http://www.onsemi.com/pub_link/Collateral/NCP1117-D.PDF
pins: 1 GND, 2 VO, 3 VI

## NCP1117-1.5_TO252
designator *  value NCP1117-1.5_TO252  Reference: U
ki_keywords: REGULATOR LDO 1.5V; ki_description: 1A Low drop-out regulator, Fixed Output 1.5V, TO-252 (DPAK); ki_fp_filters: TO?252*; Footprint: Package_TO_SOT_SMD:TO-252-2; Datasheet: http://www.onsemi.com/pub_link/Collateral/NCP1117-D.PDF
pins: 1 GND, 2 VO, 3 VI

## NCP1117-1.8_SOT223
designator *  value NCP1117-1.8_SOT223  Reference: U
ki_keywords: REGULATOR LDO 1.8V; ki_description: 1A Low drop-out regulator, Fixed Output 1.8V, SOT-223; ki_fp_filters: SOT?223*TabPin2*; Footprint: Package_TO_SOT_SMD:SOT-223-3_TabPin2; Datasheet: http://www.onsemi.com/pub_link/Collateral/NCP1117-D.PDF
pins: 1 GND, 2 VO, 3 VI

## NCP1117-1.8_TO252
designator *  value NCP1117-1.8_TO252  Reference: U
ki_keywords: REGULATOR LDO 18.V; ki_description: 1A Low drop-out regulator, Fixed Output 1.8V, TO-252 (DPAK); ki_fp_filters: TO?252*; Footprint: Package_TO_SOT_SMD:TO-252-2; Datasheet: http://www.onsemi.com/pub_link/Collateral/NCP1117-D.PDF
pins: 1 GND, 2 VO, 3 VI

## NCP1117-1.9_TO252
designator *  value NCP1117-1.9_TO252  Reference: U
ki_keywords: REGULATOR LDO 1.9V; ki_description: 1A Low drop-out regulator, Fixed Output 1.9V, TO-252 (DPAK); ki_fp_filters: TO?252*; Footprint: Package_TO_SOT_SMD:TO-252-2; Datasheet: http://www.onsemi.com/pub_link/Collateral/NCP1117-D.PDF
pins: 1 GND, 2 VO, 3 VI

## NCP1117-2.0_SOT223
designator *  value NCP1117-2.0_SOT223  Reference: U
ki_keywords: REGULATOR LDO 2V; ki_description: 1A Low drop-out regulator, Fixed Output 2V, SOT-223; ki_fp_filters: SOT?223*TabPin2*; Footprint: Package_TO_SOT_SMD:SOT-223-3_TabPin2; Datasheet: http://www.onsemi.com/pub_link/Collateral/NCP1117-D.PDF
pins: 1 GND, 2 VO, 3 VI

## NCP1117-2.0_TO252
designator *  value NCP1117-2.0_TO252  Reference: U
ki_keywords: REGULATOR LDO 2.0V 2V; ki_description: 1A Low drop-out regulator, Fixed Output 2.0V, TO-252 (DPAK); ki_fp_filters: TO?252*; Footprint: Package_TO_SOT_SMD:TO-252-2; Datasheet: http://www.onsemi.com/pub_link/Collateral/NCP1117-D.PDF
pins: 1 GND, 2 VO, 3 VI

## NCP1117-2.5_SOT223
designator *  value NCP1117-2.5_SOT223  Reference: U
ki_keywords: REGULATOR LDO 2.5V; ki_description: 1A Low drop-out regulator, Fixed Output 2.5V, SOT-223; ki_fp_filters: SOT?223*TabPin2*; Footprint: Package_TO_SOT_SMD:SOT-223-3_TabPin2; Datasheet: http://www.onsemi.com/pub_link/Collateral/NCP1117-D.PDF
pins: 1 GND, 2 VO, 3 VI

## NCP1117-2.5_TO252
designator *  value NCP1117-2.5_TO252  Reference: U
ki_keywords: REGULATOR LDO 2.5V; ki_description: 1A Low drop-out regulator, Fixed Output 2.5V, TO-252 (DPAK); ki_fp_filters: TO?252*; Footprint: Package_TO_SOT_SMD:TO-252-2; Datasheet: http://www.onsemi.com/pub_link/Collateral/NCP1117-D.PDF
pins: 1 GND, 2 VO, 3 VI

## NCP1117-2.85_SOT223
designator *  value NCP1117-2.85_SOT223  Reference: U
ki_keywords: REGULATOR LDO 2.85V; ki_description: 1A Low drop-out regulator, Fixed Output 2.85V, SOT-223; ki_fp_filters: SOT?223*TabPin2*; Footprint: Package_TO_SOT_SMD:SOT-223-3_TabPin2; Datasheet: http://www.onsemi.com/pub_link/Collateral/NCP1117-D.PDF
pins: 1 GND, 2 VO, 3 VI

## NCP1117-2.85_TO252
designator *  value NCP1117-2.85_TO252  Reference: U
ki_keywords: REGULATOR LDO 2.85V; ki_description: 1A Low drop-out regulator, Fixed Output 2.85V, TO-252 (DPAK); ki_fp_filters: TO?252*; Footprint: Package_TO_SOT_SMD:TO-252-2; Datasheet: http://www.onsemi.com/pub_link/Collateral/NCP1117-D.PDF
pins: 1 GND, 2 VO, 3 VI

## NCP1117-3.3_SOT223
designator *  value NCP1117-3.3_SOT223  Reference: U
ki_keywords: REGULATOR LDO 3.3V; ki_description: 1A Low drop-out regulator, Fixed Output 3.3V, SOT-223; ki_fp_filters: SOT?223*TabPin2*; Footprint: Package_TO_SOT_SMD:SOT-223-3_TabPin2; Datasheet: http://www.onsemi.com/pub_link/Collateral/NCP1117-D.PDF
pins: 1 GND, 2 VO, 3 VI

## NCP1117-3.3_TO252
designator *  value NCP1117-3.3_TO252  Reference: U
ki_keywords: REGULATOR LDO 3.3V; ki_description: 1A Low drop-out regulator, Fixed Output 3.3V, TO-252 (DPAK); ki_fp_filters: TO?252*; Footprint: Package_TO_SOT_SMD:TO-252-2; Datasheet: http://www.onsemi.com/pub_link/Collateral/NCP1117-D.PDF
pins: 1 GND, 2 VO, 3 VI

## NCP1117-5.0_SOT223
designator *  value NCP1117-5.0_SOT223  Reference: U
ki_keywords: REGULATOR LDO 5V; ki_description: 1A Low drop-out regulator, Fixed Output 5V, SOT-223; ki_fp_filters: SOT?223*TabPin2*; Footprint: Package_TO_SOT_SMD:SOT-223-3_TabPin2; Datasheet: http://www.onsemi.com/pub_link/Collateral/NCP1117-D.PDF
pins: 1 GND, 2 VO, 3 VI

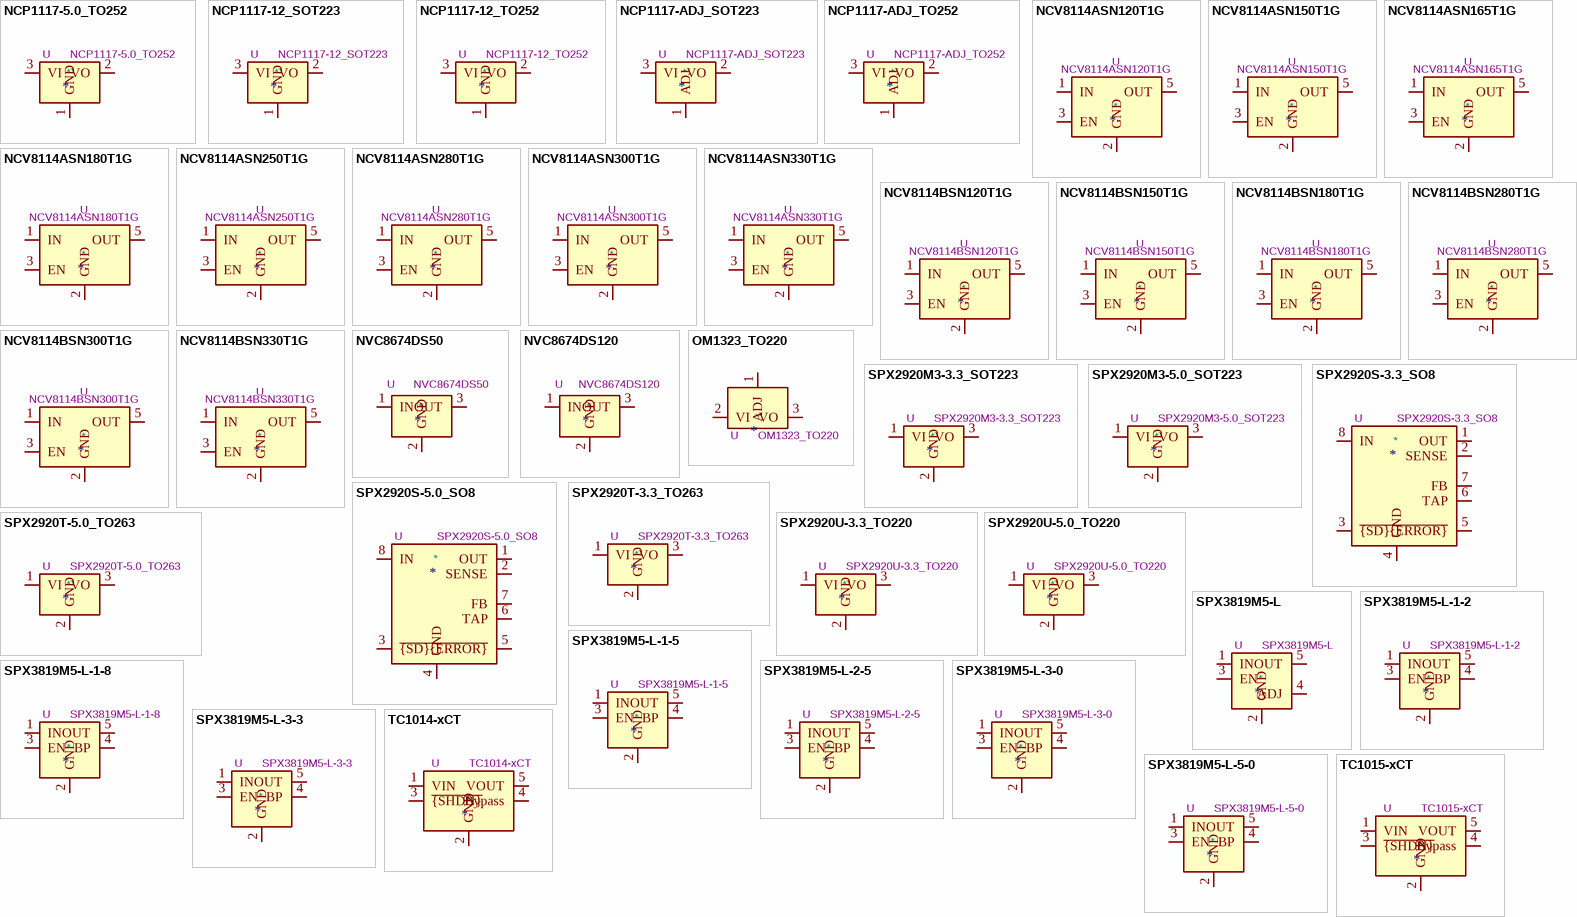
[diagram p29: symbols NCP1117-5.0_TO252 to TC1015-xCT]

## NCP1117-5.0_TO252
designator *  value NCP1117-5.0_TO252  Reference: U
ki_keywords: REGULATOR LDO 5.0V 5V; ki_description: 1A Low drop-out regulator, Fixed Output 5.0V, TO-252 (DPAK); ki_fp_filters: TO?252*; Footprint: Package_TO_SOT_SMD:TO-252-2; Datasheet: http://www.onsemi.com/pub_link/Collateral/NCP1117-D.PDF
pins: 1 GND, 2 VO, 3 VI
